# Altium footprint library negm_library.PcbLib: 39 footprints (part 2 of 3)
Each footprint in its own frame and in the unit in brackets; x right, y up, seen from the top. Pads: shape width x height; smd on the part's side, far side on the other; paste and mask are expansions set on the pad; w line width, h text height; cw(c..) or ccw(c..) is an arc to the next point about the centre after c.
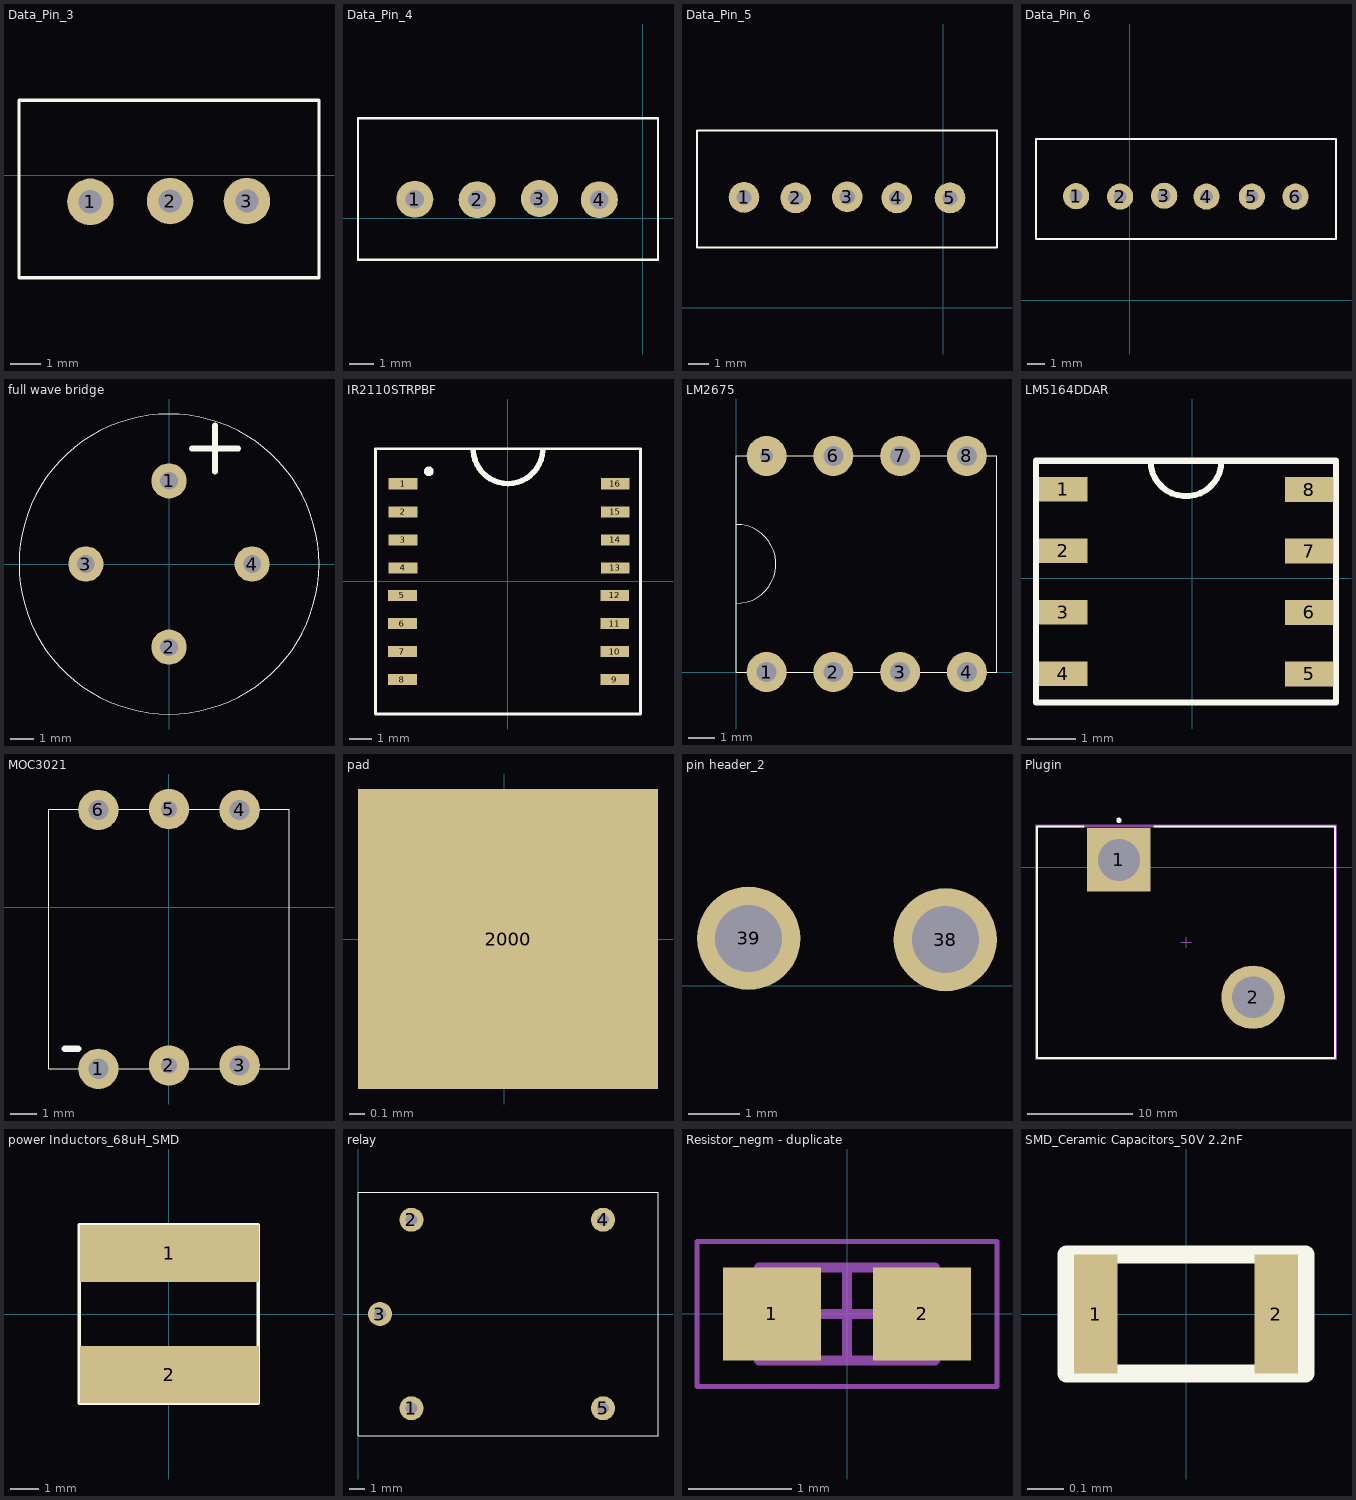
[diagram p1: the footprints below, top view; thin cyan lines are the x and y axes]

## Data_Pin_3 [mil]
pads (3):
  round 60 hole 30: 1(-362,-34) 2(-259,-33) 3(-160,-33)
Top Overlay:
  lines w3.94: -454,-132 -67,-132 -67,97 -454,97 -454,-132
3D body "JST - XH - Thru (V) - 3Pin - 2.54mm.stp": height 284, standoff -118, extent -451,-132 -67,98

## Data_Pin_4 [mil]
pads (4):
  round 60 hole 30: 1(-369,31) 2(-268,30) 3(-167,32) 4(-70,30)
Top Overlay:
  lines w3.94: -461,-67 25,-67 25,162 -461,162 -461,-67
3D body "JST - XH - Thru (V) - 4Pin - 2.54mm.stp": height 284, standoff -118, extent -460,-69 24,161

## Data_Pin_5 [mil]
pads (5):
  round 60 hole 30: 1(-390,216) 2(-289,215) 3(-188,217) 4(-91,215) 5(13,215)
Top Overlay:
  lines w3.94: -482,118 105,118 105,347 -482,347 -482,118
3D body "JST - XH - Thru (V) - 5Pin - 2.54mm.stp": height 284, standoff -118, extent -480,119 104,349

## Data_Pin_6 [mil]
pads (6):
  round 60 hole 30: 1(-123,239) 2(-22,238) 3(79,240) 4(176,238) 5(280,238) 6(380,237.99)
Top Overlay:
  lines w3.94: -215,141 473,141 473,370 -215,370 -215,141
3D body "JST - XH - Thru (V) - 6Pin - 2.54mm.stp": height 284, standoff -118, extent -214,139 470,369

## full wave bridge [mil]
pads (4):
  round 60 hole 30: 1(0,141.73) 2(0,-141.73) 3(-141.73,0) 4(141.73,0)
Top Overlay:
  circle w0.39: c0,0 r255.91
  lines w10: 78.74,236.22 78.74,157.48 78.74,196.85 39.37,196.85 118.11,196.85
3D body "User Library-WOB-1.STEP": height 220.47, standoff -137.8, extent -258.9,-258.9 258.9,258.9

## IR2110STRPBF [mm] "Half Bridge 2 2A 25ns 17ns 3.3V~20V 2A SOIC-16-300mil Gate Drivers ROHS"
pads (16):
  rect 1.3x0.5 smd: 1(-4.75,4.42) 2(-4.75,3.15) 3(-4.75,1.88) 4(-4.75,0.61) 5(-4.775,-0.635) 6(-4.775,-1.905) 7(-4.775,-3.175) 8(-4.775,-4.445) 9(4.826,-4.445) 10(4.826,-3.175) 11(4.826,-1.905) 12(4.826,-0.635) 13(4.851,0.61) 14(4.851,1.88) 15(4.851,3.15) 16(4.851,4.42)
Top Overlay:
  circle w0.254: c-3.581,4.978 r0.092
  lines w0.125: -6,-6 6,-6 6,6 -6,6 -6,-6
  lines w0.254: -1.573,5.918 ccw(c0,6) 1.574,5.921
3D body "SOIC-16-300mil.STEP": height 3.5, standoff 0, extent -5.15,-5.1 5.15,5.1

## LM2675 [mil] "buck converter  / Input Voltage: 6.5V to 40V   / Output Current: Up to 1A / Efficiency: Up to 96%Switching Frequency: 260 kHzFixed  / Output Voltages: 3.3V, 5V, 12V, and an adjustable version (1.21V to 37V)"
pads (8):
  round 60 hole 30: 1(45.28,0) 2(145.67,0) 3(246.06,0) 4(346.46,0) 6(145.67,324.8) 7(246.06,324.8) 8(346.46,324.8)
  round 60 hole 19.68: 5(45.28,324.8)
Top Overlay:
  lines w0.39: 0,103.23 ccw(c0,162.5) 0,221.77 ; 0,0 391.73,0 391.73,325 0,325 0,0
3D body "User Library-PDIP-8.STEP": height 200.79, standoff -125.2, extent -1.85,-0.6 391.85,324.6

## LM5164DDAR [mm] "Step-down type Adjustable 1.2V~100V 1A 6V~100V SO-8-EP DC-DC Converters ROHS"
pads (8):
  rect 1x0.51 smd: 1(-2.666,1.834) 2(-2.666,0.564) 3(-2.666,-0.706) 4(-2.666,-1.976) 5(2.423,-1.981) 6(2.423,-0.711) 7(2.423,0.559) 8(2.423,1.829)
Top Overlay:
  lines w0.125: -0.86,2.424 ccw(c-0.127,2.424) 0.606,2.424 ; -3.227,-2.576 -3.227,2.424 2.973,2.424 2.973,-2.576 -3.227,-2.576
3D body "User Library-SO8-1.sldprt": height 1.73, standoff -0.02, extent -3.176,-2.591 3.024,2.409

## MOC3021 [mil]
pads (6):
  round 60 hole 30: 1(-105,-240) 3(105,-235) 4(105,145) 6(-105,145)
  round 60 hole 24.41: 2(0,-235) 5(0,146.06)
Top Overlay:
  lines w0.39: -178.54,-240 178.55,-240 178.55,146.07 -178.54,146.07 -178.54,-240
  lines w10: -155,-210 -135,-210
3D body "User Library-Optoacoplador_MOC3020.STEP": height 120.98, standoff -181.45, extent -165,-256.76 185,166.76

## pad [mm]
pads (1):
  rect 2x2 smd: 2000(0.025,0)

## pin header_2 [mm] "pin header_2"
pads (2):
  round 2 hole 1.3: 38(5.486,0.889) 39(1.676,0.914)
3D body "pin header_2.stp": height 9, standoff -3.5, extent -0.254,-0.435 7.366,2.365

## Plugin [mm]
pads (2):
  rect 6.01x6.01 hole 3.96 paste-2539.97 mask+0: 1(51.333,0.713)
  round 6.01 hole 3.96 paste-2539.97 mask+0: 2(64.033,-12.287)
Top Overlay:
  circle w0.25: c51.333,4.463 r0.125
  lines w0.2: 47.953,3.863 43.583,3.863 43.583,-18.037 71.783,-18.037 71.783,3.863 54.713,3.863
Top 3D Body:
  lines w0.2: 43.583,-18.037 43.583,3.863 71.783,3.863 71.783,-18.037 43.583,-18.037
Board:
  lines w0.2: 43.483,-18.137 43.483,3.963 71.883,3.963 71.883,-18.137 43.483,-18.137
Top Assembly:
  lines w0.2: 43.483,-18.137 43.483,3.963 71.883,3.963 71.883,-18.137 43.483,-18.137
  text ".Designator" at 57.683,-6.899 h1
Top Component Center:
  lines w0.1: 57.183,-7.087 58.183,-7.087 ; 57.683,-7.587 57.683,-6.587
3D body "Conn_Molex_38969-0002_eec.STEP": height 0.25, standoff 0, extent 43.483,-18.137 71.883,3.963

## power Inductors_68uH_SMD [mm] "850mA 68uH ±20% 950mA SMD,6x6mm Power Inductors ROHS"
pads (2):
  rect 6.3x2 smd: 1(0.025,2.134) 2(0.025,-2.134)
Top Overlay:
  lines w0.125: -3.15,-3.15 3.15,-3.15 3.15,3.15 -3.15,3.15 -3.15,-3.15
3D body "power_Inductance_6mmx6mm.STEP": height 2.8, standoff 0.01, extent -3.025,-3.01 2.975,3.01

## relay [mil]
pads (5):
  round 60 hole 30: 1(133.86,-236.22) 2(133.86,236.22) 3(55.12,0) 4(614.17,236.22) 5(614.17,-236.22)
Top Overlay:
  lines w0.39: 0,-305.12 751.97,-305.12 751.97,305.12 0,305.12 0,-305.12
3D body "User Library-HFFDxxx-Z_relay.STEP": height 590.55, standoff -137.8, extent 0,-299.21 748.03,299.21

## Resistor_negm - duplicate [mm] "Chip Resistor, 2-Leads, Body 1.60x0.80mm, IPC Medium Density_100mW Thick Film Resistors 75V ±100ppm/? ±1% 1kO 0603 Chip Resistor - Surface Mount ROHS"
height 0.55
pads (2):
  rect 0.95x0.9 smd: 1(-0.725,0) 2(0.725,0)
Mechanical 13:
  lines w0.1: -0.85,-0.45 0.85,-0.45 0.85,0.45 -0.85,0.45 -0.85,-0.45
Mechanical 15:
  lines w0.05: -1.45,-0.7 1.45,-0.7 1.45,0.7 -1.45,0.7 -1.45,-0.7
  lines w0.1: -0.45,0 0.45,0 ; 0,-0.45 0,0.45
3D body "Resistor_negm.step": height 0.55, standoff 0, extent -0.85,-0.45 0.85,0.45

## SMD_Ceramic Capacitors_50V 2.2nF [mm] "50V 2.2nF X7R ±10% 0201 Multilayer Ceramic Capacitors MLCC - SMD/SMT ROHS"
pads (2):
  rect 0.12x0.33 smd: 1(-0.25,0) 2(0.25,0)
Top Overlay:
  lines w0.05: -0.33,-0.165 0.33,-0.165 0.33,0.165 -0.33,0.165 -0.33,-0.165
3D body "c0201c104k9pactu.stp": height 0.28, standoff -0.05, extent -0.315,-0.178 0.315,0.152